# Altium footprint library 排母.PcbLib: 60 footprints (part 2 of 4)
Each footprint in its own frame and in the unit in brackets; x right, y up, seen from the top. Pads: shape width x height; smd on the part's side, far side on the other; paste and mask are expansions set on the pad; w line width, h text height; cw(c..) or ccw(c..) is an arc to the next point about the centre after c.
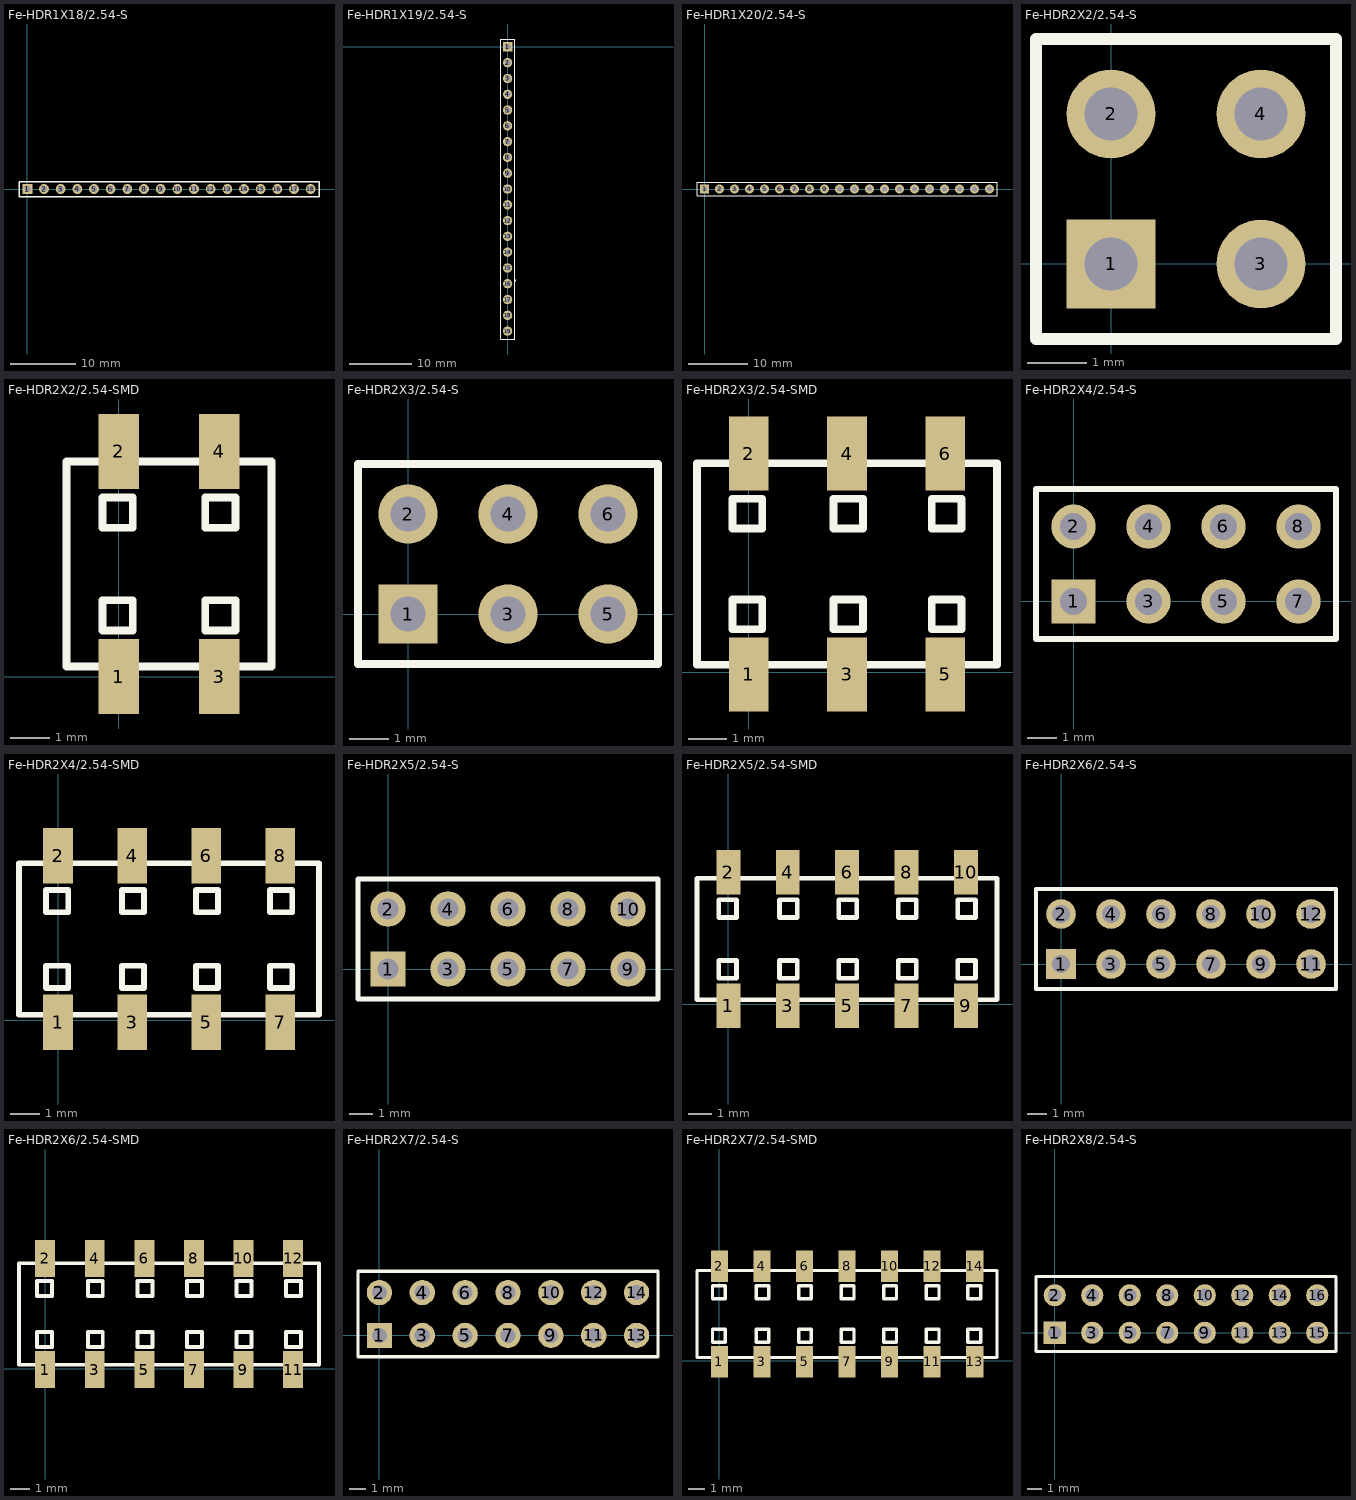
[diagram p1: the footprints below, top view; thin cyan lines are the x and y axes]

## Fe-HDR1X18/2.54-S [mm]
pads (18):
  rect 1.5x1.5 hole 0.9: 1(0,0)
  round 1.5 hole 0.9: 2(2.54,0) 3(5.08,0) 4(7.62,0) 5(10.16,0) 6(12.7,0) 7(15.24,0) 8(17.78,0) 9(20.32,0) 10(22.86,0) 11(25.4,0) 12(27.94,0) 13(30.48,0) 14(33.02,0) 15(35.56,0) 16(38.1,0) 17(40.64,0) 18(43.18,0)
Top Overlay:
  lines w0.2: -1.27,-1.143 44.45,-1.143 44.45,1.143 0.762,1.143 -1.27,1.143 -1.27,-1.143
3D body "Female-Header-2.54-Single-18.stp": height 3.2, standoff -8.5, extent -1.393,-1.25 44.577,1.25

## Fe-HDR1X19/2.54-S [mm]
pads (19):
  rect 1.5x1.5 hole 0.9: 1(0,0)
  round 1.5 hole 0.9: 2(0,-2.54) 3(0,-5.08) 4(0,-7.62) 5(0,-10.16) 6(0,-12.7) 7(0,-15.24) 8(0,-17.78) 9(0,-20.32) 10(0,-22.86) 11(0,-25.4) 12(0,-27.94) 13(0,-30.48) 14(0,-33.02) 15(0,-35.56) 16(0,-38.1) 17(0,-40.64) 18(0,-43.18) 19(0,-45.72)
Top Overlay:
  lines w0.2: 1.27,-37.677 1.27,-37.465 ; -1.143,-46.99 -1.143,1.27 1.143,1.27 1.143,-0.508 1.143,-46.99 -1.143,-46.99
3D body "Female-Header-2.54-Single-19.stp": height 3.2, standoff -8.5, extent -1.25,-47.113 1.25,1.397

## Fe-HDR1X20/2.54-S [mm]
pads (20):
  rect 1.5x1.5 hole 0.9: 1(0,0)
  round 1.5 hole 0.9: 2(2.54,0) 3(5.08,0) 4(7.62,0) 5(10.16,0) 6(12.7,0) 7(15.24,0) 8(17.78,0) 9(20.32,0) 10(22.86,0) 11(25.4,0) 12(27.94,0) 13(30.48,0) 14(33.02,0) 15(35.56,0) 16(38.1,0) 17(40.64,0) 18(43.18,0) 19(45.72,0) 20(48.26,0)
Top Overlay:
  lines w0.2: -1.27,-1.143 -1.27,1.143 0.508,1.143 49.53,1.143 49.53,-1.143 -1.27,-1.143
3D body "Female-Header-2.54-Single-20.stp": height 2.74, standoff -8.96, extent -1.397,-1.27 49.653,1.23

## Fe-HDR2X2/2.54-S [mm] "Connector; Header; 2x2 Position"
pads (4):
  rect 1.5x1.5 hole 0.9: 1(0,0)
  round 1.5 hole 0.9: 2(0,2.54) 3(2.54,0) 4(2.54,2.54)
Top Overlay:
  lines w0.2: -1.27,-1.27 3.81,-1.27 3.81,3.81 -1.27,3.81 -1.27,-1.27
3D body "Female-Header-2.54-Double-4.stp": height 8.5, standoff -3.2, extent -1.395,-1.23 3.935,3.77

## Fe-HDR2X2/2.54-SMD [mm]
pads (4):
  rect 1.02x1.9 smd: 1(0,0) 2(0,5.7) 3(2.54,0) 4(2.54,5.7)
Top Overlay:
  lines w0.2: -1.33,0.25 -1.33,5.45 3.87,5.45 3.87,0.25 -1.33,0.25 ; -0.411,1.169 -0.411,1.931 0.351,1.931 0.351,1.169 -0.411,1.169 ; -0.411,3.769 -0.411,4.531 0.351,4.531 0.351,3.769 -0.411,3.769 ; 2.189,1.169 2.189,1.931 2.951,1.931 2.951,1.169 2.189,1.169 ; 2.189,3.769 2.189,4.531 2.951,4.531 2.951,3.769 2.189,3.769
3D body "Fe-Header2X2.STEP": height 5.14, standoff -0.01, extent -1.3,-0.304 3.84,6.096

## Fe-HDR2X3/2.54-S [mm] "Connector; Header; 3x2 Position"
pads (6):
  rect 1.5x1.5 hole 0.9: 1(0,0)
  round 1.5 hole 0.9: 2(0,2.54) 3(2.54,0) 4(2.54,2.54) 5(5.08,0) 6(5.08,2.54)
Top Overlay:
  lines w0.2: 1.482,-1.27 6.35,-1.27 ; 6.35,-1.27 6.35,3.81 -1.27,3.81 -1.27,-1.27 6.35,-1.27
3D body "Female-Header-2.54-Double-6.stp": height 8.5, standoff -3.2, extent -1.397,-1.19 6.473,3.81

## Fe-HDR2X3/2.54-SMD [mm]
pads (6):
  rect 1.02x1.9 smd: 1(0,-0.056) 2(0,5.644) 3(2.54,-0.056) 4(2.54,5.644) 5(5.08,-0.056) 6(5.08,5.644)
Top Overlay:
  lines w0.2: -1.33,0.194 -1.33,5.394 6.41,5.394 6.41,0.194 -1.33,0.194 ; -0.411,1.113 -0.411,1.875 0.351,1.875 0.351,1.113 -0.411,1.113 ; -0.411,3.713 -0.411,4.475 0.351,4.475 0.351,3.713 -0.411,3.713 ; 2.189,1.113 2.189,1.875 2.951,1.875 2.951,1.113 2.189,1.113 ; 2.189,3.713 2.189,4.475 2.951,4.475 2.951,3.713 2.189,3.713 ; 4.729,1.113 5.491,1.113 5.491,1.875 4.729,1.875 4.729,1.113 ; 4.729,3.713 5.491,3.713 5.491,4.475 4.729,4.475 4.729,3.713
3D body "Fe-Header2X1.STEP": height 5.15, standoff 0, extent -1.33,-0.304 1.27,6.096
3D body "Fe-Header2X1.STEP": height 5.15, standoff 0, extent 1.21,-0.304 3.81,6.096
3D body "Fe-Header2X1.STEP": height 5.15, standoff 0, extent 3.75,-0.304 6.35,6.096

## Fe-HDR2X4/2.54-S [mm] "Connector; Header; 4x2 Position"
pads (8):
  rect 1.5x1.5 hole 0.9: 1(0,0)
  round 1.5 hole 0.9: 2(0,2.54) 3(2.54,0) 4(2.54,2.54) 5(5.08,0) 6(5.08,2.54) 7(7.62,0) 8(7.62,2.54)
Top Overlay:
  lines w0.2: -1.27,-1.27 8.89,-1.27 8.89,3.81 -1.27,3.81 -1.27,-1.27
3D body "Female-Header-2.54-Double-8.stp": height 8.5, standoff -3.2, extent -1.266,-1.23 9.144,3.77

## Fe-HDR2X4/2.54-SMD [mm]
pads (8):
  rect 1.02x1.9 smd: 1(0,-0.056) 2(0,5.644) 3(2.54,-0.056) 4(2.54,5.644) 5(5.08,-0.056) 6(5.08,5.644) 7(7.62,-0.056) 8(7.62,5.644)
Top Overlay:
  lines w0.2: -1.34,0.194 8.95,0.194 8.95,5.394 -1.34,5.394 -1.34,0.194 ; -0.411,1.113 -0.411,1.875 0.351,1.875 0.351,1.113 -0.411,1.113 ; -0.411,3.713 -0.411,4.475 0.351,4.475 0.351,3.713 -0.411,3.713 ; 2.189,1.113 2.189,1.875 2.951,1.875 2.951,1.113 2.189,1.113 ; 2.189,3.713 2.189,4.475 2.951,4.475 2.951,3.713 2.189,3.713 ; 4.729,1.113 5.491,1.113 5.491,1.875 4.729,1.875 4.729,1.113 ; 4.729,3.713 5.491,3.713 5.491,4.475 4.729,4.475 4.729,3.713 ; 7.269,1.113 7.269,1.875 8.031,1.875 8.031,1.113 7.269,1.113 ; 7.269,3.713 7.269,4.475 8.031,4.475 8.031,3.713 7.269,3.713
3D body "Fe-Header2X1.STEP": height 5.15, standoff 0, extent 3.75,-0.304 6.35,6.096
3D body "Fe-Header2X1.STEP": height 5.15, standoff 0, extent 1.21,-0.304 3.81,6.096
3D body "Fe-Header2X1.STEP": height 5.15, standoff 0, extent -1.33,-0.304 1.27,6.096
3D body "Fe-Header2X1.STEP": height 5.15, standoff 0, extent 6.29,-0.304 8.89,6.096

## Fe-HDR2X5/2.54-S [mm] "Connector; Header; 5x2 Position"
pads (10):
  rect 1.5x1.5 hole 0.9: 1(0,0)
  round 1.5 hole 0.9: 2(0,2.54) 3(2.54,0) 4(2.54,2.54) 5(5.08,0) 6(5.08,2.54) 7(7.62,0) 8(7.62,2.54) 9(10.16,0) 10(10.16,2.54)
Top Overlay:
  lines w0.2: -1.27,-1.27 -1.27,3.81 11.43,3.81 11.43,-1.27 -1.27,-1.27
3D body "Female-Header-2.54-Double-10.stp": height 8.5, standoff -3.2, extent -1.395,-1.23 11.555,3.77

## Fe-HDR2X5/2.54-SMD [mm]
pads (10):
  rect 1.02x1.9 smd: 1(0,-0.056) 2(0,5.644) 3(2.54,-0.056) 4(2.54,5.644) 5(5.08,-0.056) 6(5.08,5.644) 7(7.62,-0.056) 8(7.62,5.644) 9(10.16,-0.056) 10(10.16,5.644)
Top Overlay:
  lines w0.2: -1.34,0.194 -1.34,5.394 11.49,5.394 11.49,0.194 -1.34,0.194 ; -0.411,1.113 0.351,1.113 0.351,1.875 -0.411,1.875 -0.411,1.113 ; -0.411,3.713 0.351,3.713 0.351,4.475 -0.411,4.475 -0.411,3.713 ; 2.189,1.113 2.951,1.113 2.951,1.875 2.189,1.875 2.189,1.113 ; 2.189,3.713 2.951,3.713 2.951,4.475 2.189,4.475 2.189,3.713 ; 4.729,1.113 4.729,1.875 5.491,1.875 5.491,1.113 4.729,1.113 ; 4.729,3.713 4.729,4.475 5.491,4.475 5.491,3.713 4.729,3.713 ; 7.269,1.113 8.031,1.113 8.031,1.875 7.269,1.875 7.269,1.113 ; 7.269,3.713 8.031,3.713 8.031,4.475 7.269,4.475 7.269,3.713 ; 9.809,1.113 10.571,1.113 10.571,1.875 9.809,1.875 9.809,1.113 ; 9.809,3.713 10.571,3.713 10.571,4.475 9.809,4.475 9.809,3.713
3D body "Fe-Header2X1.STEP": height 5.15, standoff 0, extent 6.29,-0.304 8.89,6.096
3D body "Fe-Header2X1.STEP": height 5.15, standoff 0, extent 8.83,-0.304 11.43,6.096
3D body "Fe-Header2X1.STEP": height 5.15, standoff 0, extent -1.33,-0.304 1.27,6.096
3D body "Fe-Header2X1.STEP": height 5.15, standoff 0, extent 1.21,-0.304 3.81,6.096
3D body "Fe-Header2X1.STEP": height 5.15, standoff 0, extent 3.75,-0.304 6.35,6.096

## Fe-HDR2X6/2.54-S [mm] "Connector; Header; 6x2 Position"
pads (12):
  rect 1.5x1.5 hole 0.9: 1(0,0)
  round 1.5 hole 0.9: 2(0,2.54) 3(2.54,0) 4(2.54,2.54) 5(5.08,0) 6(5.08,2.54) 7(7.62,0) 8(7.62,2.54) 9(10.16,0) 10(10.16,2.54) 11(12.7,0) 12(12.7,2.54)
Top Overlay:
  lines w0.2: -1.27,-1.27 13.97,-1.27 13.97,3.81 -1.27,3.81 -1.27,-1.27
3D body "Female-Header-2.54-Double-12.stp": height 8.5, standoff -3.2, extent -1.395,-1.23 14.095,3.77

## Fe-HDR2X6/2.54-SMD [mm]
pads (12):
  rect 1.02x1.9 smd: 1(0,-0.056) 2(0,5.644) 3(2.54,-0.056) 4(2.54,5.644) 5(5.08,-0.056) 6(5.08,5.644) 7(7.62,-0.056) 8(7.62,5.644) 9(10.16,-0.056) 10(10.16,5.644) 11(12.7,-0.056) 12(12.7,5.644)
Top Overlay:
  lines w0.2: -1.34,0.194 14.03,0.194 14.03,5.394 -1.34,5.394 -1.34,0.194 ; -0.411,1.113 0.351,1.113 0.351,1.875 -0.411,1.875 -0.411,1.113 ; -0.411,3.713 0.351,3.713 0.351,4.475 -0.411,4.475 -0.411,3.713 ; 2.189,1.113 2.951,1.113 2.951,1.875 2.189,1.875 2.189,1.113 ; 2.189,3.713 2.951,3.713 2.951,4.475 2.189,4.475 2.189,3.713 ; 4.729,1.113 4.729,1.875 5.491,1.875 5.491,1.113 4.729,1.113 ; 4.729,3.713 4.729,4.475 5.491,4.475 5.491,3.713 4.729,3.713 ; 7.269,1.113 8.031,1.113 8.031,1.875 7.269,1.875 7.269,1.113 ; 7.269,3.713 8.031,3.713 8.031,4.475 7.269,4.475 7.269,3.713 ; 9.809,1.113 10.571,1.113 10.571,1.875 9.809,1.875 9.809,1.113 ; 9.809,3.713 10.571,3.713 10.571,4.475 9.809,4.475 9.809,3.713 ; 12.349,1.113 13.111,1.113 13.111,1.875 12.349,1.875 12.349,1.113 ; 12.349,3.713 13.111,3.713 13.111,4.475 12.349,4.475 12.349,3.713
3D body "Fe-Header2X1.STEP": height 5.15, standoff 0, extent 3.75,-0.304 6.35,6.096
3D body "Fe-Header2X1.STEP": height 5.15, standoff 0, extent 1.21,-0.304 3.81,6.096
3D body "Fe-Header2X1.STEP": height 5.15, standoff 0, extent -1.33,-0.304 1.27,6.096
3D body "Fe-Header2X1.STEP": height 5.15, standoff 0, extent 8.83,-0.304 11.43,6.096
3D body "Fe-Header2X1.STEP": height 5.15, standoff 0, extent 6.29,-0.304 8.89,6.096
3D body "Fe-Header2X1.STEP": height 5.15, standoff 0, extent 11.37,-0.304 13.97,6.096

## Fe-HDR2X7/2.54-S [mm] "Connector; Header; 7x2 Position"
pads (14):
  rect 1.5x1.5 hole 0.9: 1(0,0)
  round 1.5 hole 0.9: 2(0,2.54) 3(2.54,0) 4(2.54,2.54) 5(5.08,0) 6(5.08,2.54) 7(7.62,0) 8(7.62,2.54) 9(10.16,0) 10(10.16,2.54) 11(12.7,0) 12(12.7,2.54) 13(15.24,0) 14(15.24,2.54)
Top Overlay:
  lines w0.2: -1.27,-1.27 16.51,-1.27 16.51,3.81 -1.27,3.81 -1.27,-1.27
3D body "Female-Header-2.54-Double-14.stp": height 8.5, standoff -3.2, extent -1.397,-1.19 16.633,3.81

## Fe-HDR2X7/2.54-SMD [mm]
pads (14):
  rect 1.02x1.9 smd: 1(0,-0.056) 2(0,5.644) 3(2.54,-0.056) 4(2.54,5.644) 5(5.08,-0.056) 6(5.08,5.644) 7(7.62,-0.056) 8(7.62,5.644) 9(10.16,-0.056) 10(10.16,5.644) 11(12.7,-0.056) 12(12.7,5.644) 13(15.24,-0.056) 14(15.24,5.644)
Top Overlay:
  lines w0.2: -1.34,0.194 -1.34,5.394 16.57,5.394 16.57,0.194 -1.34,0.194 ; -0.411,1.113 0.351,1.113 0.351,1.875 -0.411,1.875 -0.411,1.113 ; -0.411,3.713 0.351,3.713 0.351,4.475 -0.411,4.475 -0.411,3.713 ; 2.189,1.113 2.951,1.113 2.951,1.875 2.189,1.875 2.189,1.113 ; 2.189,3.713 2.951,3.713 2.951,4.475 2.189,4.475 2.189,3.713 ; 4.729,1.113 4.729,1.875 5.491,1.875 5.491,1.113 4.729,1.113 ; 4.729,3.713 4.729,4.475 5.491,4.475 5.491,3.713 4.729,3.713 ; 7.269,1.113 8.031,1.113 8.031,1.875 7.269,1.875 7.269,1.113 ; 7.269,3.713 8.031,3.713 8.031,4.475 7.269,4.475 7.269,3.713 ; 9.809,1.113 10.571,1.113 10.571,1.875 9.809,1.875 9.809,1.113 ; 9.809,3.713 10.571,3.713 10.571,4.475 9.809,4.475 9.809,3.713 ; 12.349,1.113 13.111,1.113 13.111,1.875 12.349,1.875 12.349,1.113 ; 12.349,3.713 13.111,3.713 13.111,4.475 12.349,4.475 12.349,3.713 ; 14.829,1.113 14.829,1.875 15.591,1.875 15.591,1.113 14.829,1.113 ; 14.829,3.713 14.829,4.475 15.591,4.475 15.591,3.713 14.829,3.713
3D body "Fe-Header2X1.STEP": height 5.15, standoff 0, extent 13.91,-0.304 16.51,6.096
3D body "Fe-Header2X1.STEP": height 5.15, standoff 0, extent 11.37,-0.304 13.97,6.096
3D body "Fe-Header2X1.STEP": height 5.15, standoff 0, extent 6.29,-0.304 8.89,6.096
3D body "Fe-Header2X1.STEP": height 5.15, standoff 0, extent 8.83,-0.304 11.43,6.096
3D body "Fe-Header2X1.STEP": height 5.15, standoff 0, extent -1.33,-0.304 1.27,6.096
3D body "Fe-Header2X1.STEP": height 5.15, standoff 0, extent 1.21,-0.304 3.81,6.096
3D body "Fe-Header2X1.STEP": height 5.15, standoff 0, extent 3.75,-0.304 6.35,6.096

## Fe-HDR2X8/2.54-S [mm] "Connector; Header; 8x2 Position"
pads (16):
  rect 1.5x1.5 hole 0.9: 1(0,0)
  round 1.5 hole 0.9: 2(0,2.54) 3(2.54,0) 4(2.54,2.54) 5(5.08,0) 6(5.08,2.54) 7(7.62,0) 8(7.62,2.54) 9(10.16,0) 10(10.16,2.54) 11(12.7,0) 12(12.7,2.54) 13(15.24,0) 14(15.24,2.54) 15(17.78,0) 16(17.78,2.54)
Top Overlay:
  lines w0.2: -1.27,-1.27 -1.27,3.81 19.05,3.81 19.05,-1.27 -1.27,-1.27
3D body "Female-Header-2.54-Double-16.stp": height 8.5, standoff -3.2, extent -1.395,-1.23 19.175,3.77